# Altium schematic symbol library jlcpcb_2025_04_capacitors_extended_1206.schlib: 2503 symbols (part 2 of 14)
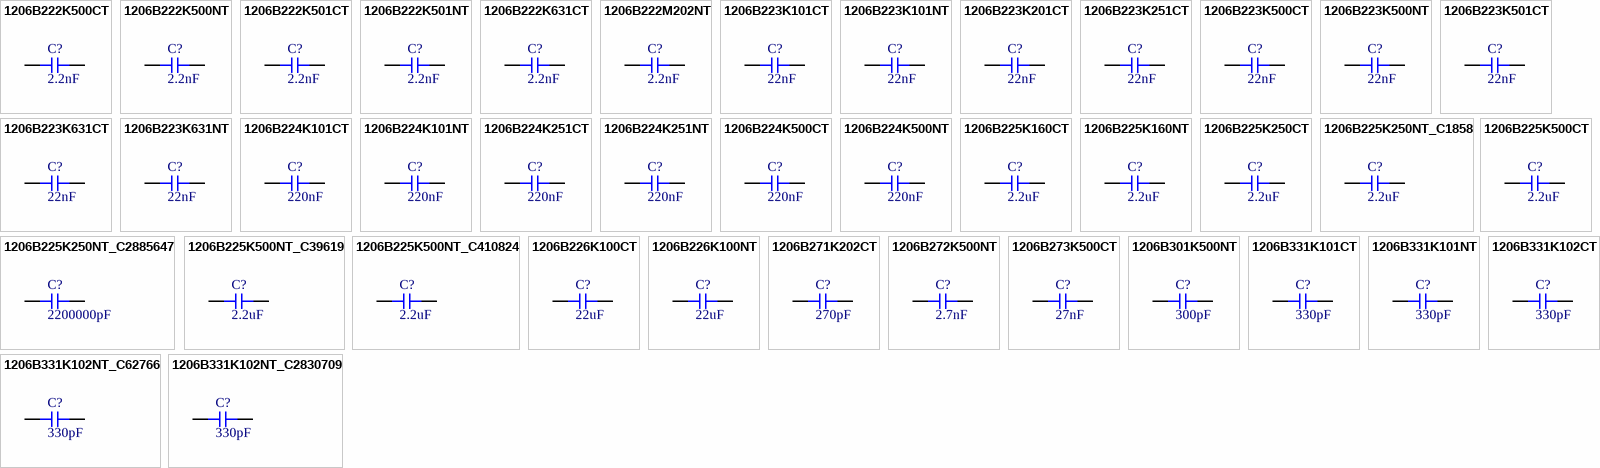
[diagram p63: symbols 1206B222K500CT to 1206B331K102NT_C2830709]

## 1206B224K500NT
designator C?  Capacitance: 220nF  (hidden comment: *)
Capacitor, Ceramic (MLCC), 220nF, ±10%, 50V, X7R, ±10%, SMD 1206; Manufacturer: FH(Guangdong Fenghua Advanced Tech); Manufacturer Part Number: 1206B224K500NT; Package Size: 1206; JLCPCB Basic Part: No; JLCPCB Part Number: C1857; Supplier 1: LCSC; Category: Capacitors - MLCC; Supplier Part Number 1: C1857; Tolerance: ±10%; Voltage Rating: 50V; Temperature Coefficient: X7R; RoHS: Yes; ComponentLink1Description: Datasheet; ComponentLink1URL: https://wmsc.lcsc.com/wmsc/upload/file/pdf/v2/lcsc/2304140030_FH--Guangdong-Fenghua-Advanced-Tech-1206B224K500NT_C1857.pdf; ComponentLink2Description: JLCPCB Part URL; ComponentLink2URL: https://jlcpcb.com/partdetail/C1857; ComponentLink3Description: LCSC Part URL; ComponentLink3URL: https://lcsc.com/product-detail/Multilayer-Ceramic-Capacitors-MLCC---SMD-SMT_FH-Guangdong-Fenghua-Advanced-Tech-FH-Guangdong-Fenghua-Advanced-Tech-1206B224K500NT_C1857.html
footprint CAP-1206 (1206 (3216M) Capacitor)
pins: 1, 2

## 1206B225K160CT
designator C?  Capacitance: 2.2uF  (hidden comment: *)
Capacitor, Ceramic (MLCC), 2.2uF, ±10%, 16V, X7R, ±10%, SMD 1206; Manufacturer: Walsin Tech Corp; Manufacturer Part Number: 1206B225K160CT; Package Size: 1206; JLCPCB Basic Part: No; JLCPCB Part Number: C123658; Supplier 1: LCSC; Category: Capacitors - MLCC; Supplier Part Number 1: C123658; Tolerance: ±10%; Voltage Rating: 16V; Temperature Coefficient: X7R; RoHS: Yes; ComponentLink1Description: Datasheet; ComponentLink1URL: https://wmsc.lcsc.com/wmsc/upload/file/pdf/v2/lcsc/2304140030_Walsin-Tech-Corp-1206B225K160CT_C123658.pdf; ComponentLink2Description: JLCPCB Part URL; ComponentLink2URL: https://jlcpcb.com/partdetail/C123658; ComponentLink3Description: LCSC Part URL; ComponentLink3URL: https://lcsc.com/product-detail/Multilayer-Ceramic-Capacitors-MLCC---SMD-SMT_Walsin-Tech-Corp-Walsin-Tech-Corp-1206B225K160CT_C123658.html
footprint CAP-1206 (1206 (3216M) Capacitor)
pins: 1, 2

## 1206B225K160NT
designator C?  Capacitance: 2.2uF  (hidden comment: *)
Capacitor, Ceramic (MLCC), 2.2uF, ±10%, 16V, X5R, ±10%, SMD 1206; Manufacturer: FH(Guangdong Fenghua Advanced Tech); Manufacturer Part Number: 1206B225K160NT; Package Size: 1206; JLCPCB Basic Part: No; JLCPCB Part Number: C32071; Supplier 1: LCSC; Category: Capacitors - MLCC; Supplier Part Number 1: C32071; Tolerance: ±10%; Voltage Rating: 16V; Temperature Coefficient: X5R; RoHS: Yes; ComponentLink1Description: Datasheet; ComponentLink1URL: https://wmsc.lcsc.com/wmsc/upload/file/pdf/v2/lcsc/1810311313_FH--Guangdong-Fenghua-Advanced-Tech-1206B225K160NT_C32071.pdf; ComponentLink2Description: JLCPCB Part URL; ComponentLink2URL: https://jlcpcb.com/partdetail/C32071; ComponentLink3Description: LCSC Part URL; ComponentLink3URL: https://lcsc.com/product-detail/Multilayer-Ceramic-Capacitors-MLCC---SMD-SMT_FH-Guangdong-Fenghua-Advanced-Tech-FH-Guangdong-Fenghua-Advanced-Tech-1206B225K160NT_C32071.html
footprint CAP-1206 (1206 (3216M) Capacitor)
pins: 1, 2

## 1206B225K250CT
designator C?  Capacitance: 2.2uF  (hidden comment: *)
Capacitor, Ceramic (MLCC), 2.2uF, ±10%, 25V, X7R, ±10%, SMD 1206; Manufacturer: Walsin Tech Corp; Manufacturer Part Number: 1206B225K250CT; Package Size: 1206; JLCPCB Basic Part: No; JLCPCB Part Number: C303957; Supplier 1: LCSC; Category: Capacitors - MLCC; Supplier Part Number 1: C303957; Tolerance: ±10%; Voltage Rating: 25V; Temperature Coefficient: X7R; RoHS: Yes; ComponentLink1Description: Datasheet; ComponentLink1URL: https://wmsc.lcsc.com/wmsc/upload/file/pdf/v2/lcsc/2304140030_Walsin-Tech-Corp-1206B225K250CT_C303957.pdf; ComponentLink2Description: JLCPCB Part URL; ComponentLink2URL: https://jlcpcb.com/partdetail/C303957; ComponentLink3Description: LCSC Part URL; ComponentLink3URL: https://lcsc.com/product-detail/Multilayer-Ceramic-Capacitors-MLCC---SMD-SMT_Walsin-Tech-Corp-Walsin-Tech-Corp-1206B225K250CT_C303957.html
footprint CAP-1206 (1206 (3216M) Capacitor)
pins: 1, 2

## 1206B225K250NT_C1858
designator C?  Capacitance: 2.2uF  (hidden comment: *)
Capacitor, Ceramic (MLCC), 2.2uF, ±10%, 25V, X7R, ±10%, SMD 1206; Manufacturer: FH(Guangdong Fenghua Advanced Tech); Manufacturer Part Number: 1206B225K250NT; Package Size: 1206; JLCPCB Basic Part: No; JLCPCB Part Number: C1858; Supplier 1: LCSC; Category: Capacitors - MLCC; Supplier Part Number 1: C1858; Tolerance: ±10%; Voltage Rating: 25V; Temperature Coefficient: X7R; RoHS: Yes; ComponentLink1Description: Datasheet; ComponentLink1URL: https://wmsc.lcsc.com/wmsc/upload/file/pdf/v2/lcsc/2304140030_FH--Guangdong-Fenghua-Advanced-Tech-1206B225K250NT_C1858.pdf; ComponentLink2Description: JLCPCB Part URL; ComponentLink2URL: https://jlcpcb.com/partdetail/C1858; ComponentLink3Description: LCSC Part URL; ComponentLink3URL: https://lcsc.com/product-detail/Multilayer-Ceramic-Capacitors-MLCC---SMD-SMT_FH-Guangdong-Fenghua-Advanced-Tech-FH-Guangdong-Fenghua-Advanced-Tech-1206B225K250NT_C1858.html
footprint CAP-1206 (1206 (3216M) Capacitor)
pins: 1, 2

## 1206B225K250NT_C2885647
designator C?  Capacitance: 2200000pF  (hidden comment: *)
Capacitor, Ceramic (MLCC), 2200000pF, ±10%, 25V, X7R, ±10%, SMD 1206; Manufacturer: FH (Guangdong Fenghua Advanced Tech); Manufacturer Part Number: 1206B225K250NT; Package Size: 1206; JLCPCB Basic Part: No; JLCPCB Part Number: C2885647; Supplier 1: LCSC; Category: Capacitors - MLCC; Supplier Part Number 1: C2885647; Tolerance: ±10%; Voltage Rating: 25V; Temperature Coefficient: X7R; RoHS: Yes; ComponentLink1Description: Datasheet; ComponentLink1URL: https://wmsc.lcsc.com/wmsc/upload/file/pdf/v2/lcsc/2108150430_FH--Guangdong-Fenghua-Advanced-Tech-1206B225K250NT_C2885647.pdf; ComponentLink2Description: JLCPCB Part URL; ComponentLink2URL: https://jlcpcb.com/partdetail/C2885647; ComponentLink3Description: LCSC Part URL; ComponentLink3URL: https://lcsc.com/product-detail/Multilayer-Ceramic-Capacitors-MLCC---SMD-SMT_FH-Guangdong-Fenghua-Advanced-Tech-FH-Guangdong-Fenghua-Advanced-Tech-1206B225K250NT_C2885647.html
footprint CAP-1206 (1206 (3216M) Capacitor)
pins: 1, 2

## 1206B225K500CT
designator C?  Capacitance: 2.2uF  (hidden comment: *)
Capacitor, Ceramic (MLCC), 2.2uF, ±10%, 50V, X7R, ±10%, SMD 1206; Manufacturer: Walsin Tech Corp; Manufacturer Part Number: 1206B225K500CT; Package Size: 1206; JLCPCB Basic Part: No; JLCPCB Part Number: C396788; Supplier 1: LCSC; Category: Capacitors - MLCC; Supplier Part Number 1: C396788; Tolerance: ±10%; Voltage Rating: 50V; Temperature Coefficient: X7R; RoHS: Yes; ComponentLink1Description: Datasheet; ComponentLink1URL: https://wmsc.lcsc.com/wmsc/upload/file/pdf/v2/lcsc/2304140030_Walsin-Tech-Corp-1206B225K500CT_C396788.pdf; ComponentLink2Description: JLCPCB Part URL; ComponentLink2URL: https://jlcpcb.com/partdetail/C396788; ComponentLink3Description: LCSC Part URL; ComponentLink3URL: https://lcsc.com/product-detail/Multilayer-Ceramic-Capacitors-MLCC---SMD-SMT_Walsin-Tech-Corp-Walsin-Tech-Corp-1206B225K500CT_C396788.html
footprint CAP-1206 (1206 (3216M) Capacitor)
pins: 1, 2

## 1206B225K500NT_C39619
designator C?  Capacitance: 2.2uF  (hidden comment: *)
Capacitor, Ceramic (MLCC), 2.2uF, ±10%, 50V, X7R, ±10%, SMD 1206; Manufacturer: FH(Guangdong Fenghua Advanced Tech); Manufacturer Part Number: 1206B225K500NT; Package Size: 1206; JLCPCB Basic Part: No; JLCPCB Part Number: C39619; Supplier 1: LCSC; Category: Capacitors - MLCC; Supplier Part Number 1: C39619; Tolerance: ±10%; Voltage Rating: 50V; Temperature Coefficient: X7R; RoHS: Yes; ComponentLink1Description: Datasheet; ComponentLink1URL: https://wmsc.lcsc.com/wmsc/upload/file/pdf/v2/lcsc/2304140030_FH--Guangdong-Fenghua-Advanced-Tech-1206B225K500NT_C39619.pdf; ComponentLink2Description: JLCPCB Part URL; ComponentLink2URL: https://jlcpcb.com/partdetail/C39619; ComponentLink3Description: LCSC Part URL; ComponentLink3URL: https://lcsc.com/product-detail/Multilayer-Ceramic-Capacitors-MLCC---SMD-SMT_FH-Guangdong-Fenghua-Advanced-Tech-FH-Guangdong-Fenghua-Advanced-Tech-1206B225K500NT_C39619.html
footprint CAP-1206 (1206 (3216M) Capacitor)
pins: 1, 2

## 1206B225K500NT_C410824
designator C?  Capacitance: 2.2uF  (hidden comment: *)
Capacitor, Ceramic (MLCC), 2.2uF, ±10%, 50V, X7R, ±10%, SMD 1206; Manufacturer: FH(Guangdong Fenghua Advanced Tech); Manufacturer Part Number: 1206B225K500NT; Package Size: 1206; JLCPCB Basic Part: No; JLCPCB Part Number: C410824; Supplier 1: LCSC; Category: Capacitors - MLCC; Supplier Part Number 1: C410824; Tolerance: ±10%; Voltage Rating: 50V; Temperature Coefficient: X7R; RoHS: Yes; ComponentLink1Description: Datasheet; ComponentLink1URL: https://wmsc.lcsc.com/wmsc/upload/file/pdf/v2/lcsc/2304140030_FH--Guangdong-Fenghua-Advanced-Tech-1206B225K500NT_C410824.pdf; ComponentLink2Description: JLCPCB Part URL; ComponentLink2URL: https://jlcpcb.com/partdetail/C410824; ComponentLink3Description: LCSC Part URL; ComponentLink3URL: https://lcsc.com/product-detail/Multilayer-Ceramic-Capacitors-MLCC---SMD-SMT_FH-Guangdong-Fenghua-Advanced-Tech-FH-Guangdong-Fenghua-Advanced-Tech-1206B225K500NT_C410824.html
footprint CAP-1206 (1206 (3216M) Capacitor)
pins: 1, 2

## 1206B226K100CT
designator C?  Capacitance: 22uF  (hidden comment: *)
Capacitor, Ceramic (MLCC), 22uF, ±10%, 10V, X7R, ±10%, SMD 1206; Manufacturer: Walsin Tech Corp; Manufacturer Part Number: 1206B226K100CT; Package Size: 1206; JLCPCB Basic Part: No; JLCPCB Part Number: C237195; Supplier 1: LCSC; Category: Capacitors - MLCC; Supplier Part Number 1: C237195; Tolerance: ±10%; Voltage Rating: 10V; Temperature Coefficient: X7R; RoHS: Yes; ComponentLink1Description: Datasheet; ComponentLink1URL: https://wmsc.lcsc.com/wmsc/upload/file/pdf/v2/lcsc/2209151800_Walsin-Tech-Corp-1206B226K100CT_C237195.pdf; ComponentLink2Description: JLCPCB Part URL; ComponentLink2URL: https://jlcpcb.com/partdetail/C237195; ComponentLink3Description: LCSC Part URL; ComponentLink3URL: https://lcsc.com/product-detail/Multilayer-Ceramic-Capacitors-MLCC---SMD-SMT_Walsin-Tech-Corp-Walsin-Tech-Corp-1206B226K100CT_C237195.html
footprint CAP-1206 (1206 (3216M) Capacitor)
pins: 1, 2

## 1206B226K100NT
designator C?  Capacitance: 22uF  (hidden comment: *)
Capacitor, Ceramic (MLCC), 22uF, ±10%, 10V, X7R, ±10%, SMD 1206; Manufacturer: FH(Guangdong Fenghua Advanced Tech); Manufacturer Part Number: 1206B226K100NT; Package Size: 1206; JLCPCB Basic Part: No; JLCPCB Part Number: C105475; Supplier 1: LCSC; Category: Capacitors - MLCC; Supplier Part Number 1: C105475; Tolerance: ±10%; Voltage Rating: 10V; Temperature Coefficient: X7R; RoHS: Yes; ComponentLink1Description: Datasheet; ComponentLink1URL: https://wmsc.lcsc.com/wmsc/upload/file/pdf/v2/lcsc/2304140030_FH--Guangdong-Fenghua-Advanced-Tech-1206B226K100NT_C105475.pdf; ComponentLink2Description: JLCPCB Part URL; ComponentLink2URL: https://jlcpcb.com/partdetail/C105475; ComponentLink3Description: LCSC Part URL; ComponentLink3URL: https://lcsc.com/product-detail/Multilayer-Ceramic-Capacitors-MLCC---SMD-SMT_FH-Guangdong-Fenghua-Advanced-Tech-FH-Guangdong-Fenghua-Advanced-Tech-1206B226K100NT_C105475.html
footprint CAP-1206 (1206 (3216M) Capacitor)
pins: 1, 2

## 1206B271K202CT
designator C?  Capacitance: 270pF  (hidden comment: *)
Capacitor, Ceramic (MLCC), 270pF, ±10%, 2kV, X7R, ±10%, SMD 1206; Manufacturer: Walsin Tech Corp; Manufacturer Part Number: 1206B271K202CT; Package Size: 1206; JLCPCB Basic Part: No; JLCPCB Part Number: C3881185; Supplier 1: LCSC; Category: Capacitors - MLCC; Supplier Part Number 1: C3881185; Tolerance: ±10%; Voltage Rating: 2kV; Temperature Coefficient: X7R; RoHS: Yes; ComponentLink1Description: Datasheet; ComponentLink1URL: https://wmsc.lcsc.com/wmsc/upload/file/pdf/v2/lcsc/2309201537_Walsin-Tech-Corp-1206B271K202CT_C3881185.pdf; ComponentLink2Description: JLCPCB Part URL; ComponentLink2URL: https://jlcpcb.com/partdetail/C3881185; ComponentLink3Description: LCSC Part URL; ComponentLink3URL: https://lcsc.com/product-detail/Multilayer-Ceramic-Capacitors-MLCC---SMD-SMT_Walsin-Tech-Corp-Walsin-Tech-Corp-1206B271K202CT_C3881185.html
footprint CAP-1206 (1206 (3216M) Capacitor)
pins: 1, 2

## 1206B272K500NT
designator C?  Capacitance: 2.7nF  (hidden comment: *)
Capacitor, Ceramic (MLCC), 2.7nF, ±10%, 50V, X7R, ±10%, SMD 1206; Manufacturer: FH(Guangdong Fenghua Advanced Tech); Manufacturer Part Number: 1206B272K500NT; Package Size: 1206; JLCPCB Basic Part: No; JLCPCB Part Number: C1860; Supplier 1: LCSC; Category: Capacitors - MLCC; Supplier Part Number 1: C1860; Tolerance: ±10%; Voltage Rating: 50V; Temperature Coefficient: X7R; RoHS: Yes; ComponentLink1Description: Datasheet; ComponentLink1URL: https://wmsc.lcsc.com/wmsc/upload/file/pdf/v2/lcsc/2304140030_FH--Guangdong-Fenghua-Advanced-Tech-1206B272K500NT_C1860.pdf; ComponentLink2Description: JLCPCB Part URL; ComponentLink2URL: https://jlcpcb.com/partdetail/C1860; ComponentLink3Description: LCSC Part URL; ComponentLink3URL: https://lcsc.com/product-detail/Multilayer-Ceramic-Capacitors-MLCC---SMD-SMT_FH-Guangdong-Fenghua-Advanced-Tech-FH-Guangdong-Fenghua-Advanced-Tech-1206B272K500NT_C1860.html
footprint CAP-1206 (1206 (3216M) Capacitor)
pins: 1, 2

## 1206B273K500CT
designator C?  Capacitance: 27nF  (hidden comment: *)
Capacitor, Ceramic (MLCC), 27nF, ±10%, 50V, X7R, ±10%, SMD 1206; Manufacturer: Walsin Tech Corp; Manufacturer Part Number: 1206B273K500CT; Package Size: 1206; JLCPCB Basic Part: No; JLCPCB Part Number: C152834; Supplier 1: LCSC; Category: Capacitors - MLCC; Supplier Part Number 1: C152834; Tolerance: ±10%; Voltage Rating: 50V; Temperature Coefficient: X7R; RoHS: Yes; ComponentLink1Description: Datasheet; ComponentLink1URL: https://wmsc.lcsc.com/wmsc/upload/file/pdf/v2/lcsc/2304140030_Walsin-Tech-Corp-1206B273K500CT_C152834.pdf; ComponentLink2Description: JLCPCB Part URL; ComponentLink2URL: https://jlcpcb.com/partdetail/C152834; ComponentLink3Description: LCSC Part URL; ComponentLink3URL: https://lcsc.com/product-detail/Multilayer-Ceramic-Capacitors-MLCC---SMD-SMT_Walsin-Tech-Corp-Walsin-Tech-Corp-1206B273K500CT_C152834.html
footprint CAP-1206 (1206 (3216M) Capacitor)
pins: 1, 2

## 1206B301K500NT
designator C?  Capacitance: 300pF  (hidden comment: *)
Capacitor, Ceramic (MLCC), 300pF, ±10%, 50V, X7R, ±10%, SMD 1206; Manufacturer: FH(Guangdong Fenghua Advanced Tech); Manufacturer Part Number: 1206B301K500NT; Package Size: 1206; JLCPCB Basic Part: No; JLCPCB Part Number: C1861; Supplier 1: LCSC; Category: Capacitors - MLCC; Supplier Part Number 1: C1861; Tolerance: ±10%; Voltage Rating: 50V; Temperature Coefficient: X7R; RoHS: Yes; ComponentLink1Description: Datasheet; ComponentLink1URL: https://wmsc.lcsc.com/wmsc/upload/file/pdf/v2/lcsc/2304140030_FH--Guangdong-Fenghua-Advanced-Tech-1206B301K500NT_C1861.pdf; ComponentLink2Description: JLCPCB Part URL; ComponentLink2URL: https://jlcpcb.com/partdetail/C1861; ComponentLink3Description: LCSC Part URL; ComponentLink3URL: https://lcsc.com/product-detail/Multilayer-Ceramic-Capacitors-MLCC---SMD-SMT_FH-Guangdong-Fenghua-Advanced-Tech-FH-Guangdong-Fenghua-Advanced-Tech-1206B301K500NT_C1861.html
footprint CAP-1206 (1206 (3216M) Capacitor)
pins: 1, 2

## 1206B331K101CT
designator C?  Capacitance: 330pF  (hidden comment: *)
Capacitor, Ceramic (MLCC), 330pF, ±10%, 100V, X7R, ±10%, SMD 1206; Manufacturer: Walsin Tech Corp; Manufacturer Part Number: 1206B331K101CT; Package Size: 1206; JLCPCB Basic Part: No; JLCPCB Part Number: C152965; Supplier 1: LCSC; Category: Capacitors - MLCC; Supplier Part Number 1: C152965; Tolerance: ±10%; Voltage Rating: 100V; Temperature Coefficient: X7R; RoHS: Yes; ComponentLink1Description: Datasheet; ComponentLink1URL: https://wmsc.lcsc.com/wmsc/upload/file/pdf/v2/lcsc/2304140030_Walsin-Tech-Corp-1206B331K101CT_C152965.pdf; ComponentLink2Description: JLCPCB Part URL; ComponentLink2URL: https://jlcpcb.com/partdetail/C152965; ComponentLink3Description: LCSC Part URL; ComponentLink3URL: https://lcsc.com/product-detail/Multilayer-Ceramic-Capacitors-MLCC---SMD-SMT_Walsin-Tech-Corp-Walsin-Tech-Corp-1206B331K101CT_C152965.html
footprint CAP-1206 (1206 (3216M) Capacitor)
pins: 1, 2

## 1206B331K101NT
designator C?  Capacitance: 330pF  (hidden comment: *)
Capacitor, Ceramic (MLCC), 330pF, ±10%, 100V, X7R, ±10%, SMD 1206; Manufacturer: FH(Guangdong Fenghua Advanced Tech); Manufacturer Part Number: 1206B331K101NT; Package Size: 1206; JLCPCB Basic Part: No; JLCPCB Part Number: C507079; Supplier 1: LCSC; Category: Capacitors - MLCC; Supplier Part Number 1: C507079; Tolerance: ±10%; Voltage Rating: 100V; Temperature Coefficient: X7R; RoHS: Yes; ComponentLink1Description: Datasheet; ComponentLink1URL: https://wmsc.lcsc.com/wmsc/upload/file/pdf/v2/lcsc/2304140030_FH--Guangdong-Fenghua-Advanced-Tech-1206B331K101NT_C507079.pdf; ComponentLink2Description: JLCPCB Part URL; ComponentLink2URL: https://jlcpcb.com/partdetail/C507079; ComponentLink3Description: LCSC Part URL; ComponentLink3URL: https://lcsc.com/product-detail/Multilayer-Ceramic-Capacitors-MLCC---SMD-SMT_FH-Guangdong-Fenghua-Advanced-Tech-FH-Guangdong-Fenghua-Advanced-Tech-1206B331K101NT_C507079.html
footprint CAP-1206 (1206 (3216M) Capacitor)
pins: 1, 2

## 1206B331K102CT
designator C?  Capacitance: 330pF  (hidden comment: *)
Capacitor, Ceramic (MLCC), 330pF, ±10%, 1kV, X7R, ±10%, SMD 1206; Manufacturer: Walsin Tech Corp; Manufacturer Part Number: 1206B331K102CT; Package Size: 1206; JLCPCB Basic Part: No; JLCPCB Part Number: C384737; Supplier 1: LCSC; Category: Capacitors - MLCC; Supplier Part Number 1: C384737; Tolerance: ±10%; Voltage Rating: 1kV; Temperature Coefficient: X7R; RoHS: Yes; ComponentLink1Description: Datasheet; ComponentLink1URL: https://wmsc.lcsc.com/wmsc/upload/file/pdf/v2/lcsc/2304140030_Walsin-Tech-Corp-1206B331K102CT_C384737.pdf; ComponentLink2Description: JLCPCB Part URL; ComponentLink2URL: https://jlcpcb.com/partdetail/C384737; ComponentLink3Description: LCSC Part URL; ComponentLink3URL: https://lcsc.com/product-detail/Multilayer-Ceramic-Capacitors-MLCC---SMD-SMT_Walsin-Tech-Corp-Walsin-Tech-Corp-1206B331K102CT_C384737.html
footprint CAP-1206 (1206 (3216M) Capacitor)
pins: 1, 2

## 1206B331K102NT_C62766
designator C?  Capacitance: 330pF  (hidden comment: *)
Capacitor, Ceramic (MLCC), 330pF, ±10%, 1kV, X7R, ±10%, SMD 1206; Manufacturer: FH(Guangdong Fenghua Advanced Tech); Manufacturer Part Number: 1206B331K102NT; Package Size: 1206; JLCPCB Basic Part: No; JLCPCB Part Number: C62766; Supplier 1: LCSC; Category: Capacitors - MLCC; Supplier Part Number 1: C62766; Tolerance: ±10%; Voltage Rating: 1kV; Temperature Coefficient: X7R; RoHS: Yes; ComponentLink1Description: Datasheet; ComponentLink1URL: https://wmsc.lcsc.com/wmsc/upload/file/pdf/v2/lcsc/2304140030_FH--Guangdong-Fenghua-Advanced-Tech-1206B331K102NT_C62766.pdf; ComponentLink2Description: JLCPCB Part URL; ComponentLink2URL: https://jlcpcb.com/partdetail/C62766; ComponentLink3Description: LCSC Part URL; ComponentLink3URL: https://lcsc.com/product-detail/Multilayer-Ceramic-Capacitors-MLCC---SMD-SMT_FH-Guangdong-Fenghua-Advanced-Tech-FH-Guangdong-Fenghua-Advanced-Tech-1206B331K102NT_C62766.html
footprint CAP-1206 (1206 (3216M) Capacitor)
pins: 1, 2

## 1206B331K102NT_C2830709
designator C?  Capacitance: 330pF  (hidden comment: *)
Capacitor, Ceramic (MLCC), 330pF, ±10%, 1kV, ±10%, SMD 1206; Manufacturer: FH-BK(Guangdong Fenghua Bangke Elec); Manufacturer Part Number: 1206B331K102NT; Package Size: 1206; JLCPCB Basic Part: No; JLCPCB Part Number: C2830709; Supplier 1: LCSC; Category: Capacitors - MLCC; Supplier Part Number 1: C2830709; Tolerance: ±10%; Voltage Rating: 1kV; RoHS: Yes; ComponentLink1Description: Datasheet; ComponentLink1URL: https://wmsc.lcsc.com/wmsc/upload/file/pdf/v2/lcsc/2105241612_FH-BK-Guangdong-Fenghua-Bangke-Elec-1206B331K102NT_C2830709.pdf; ComponentLink2Description: JLCPCB Part URL; ComponentLink2URL: https://jlcpcb.com/partdetail/C2830709; ComponentLink3Description: LCSC Part URL; ComponentLink3URL: https://lcsc.com/product-detail/Multilayer-Ceramic-Capacitors-MLCC---SMD-SMT_FH-BKGuangdong-Fenghua-Bangke-Elec-FH-BKGuangdong-Fenghua-Bangke-Elec-1206B331K102NT_C2830709.html
footprint CAP-1206 (1206 (3216M) Capacitor)
pins: 1, 2

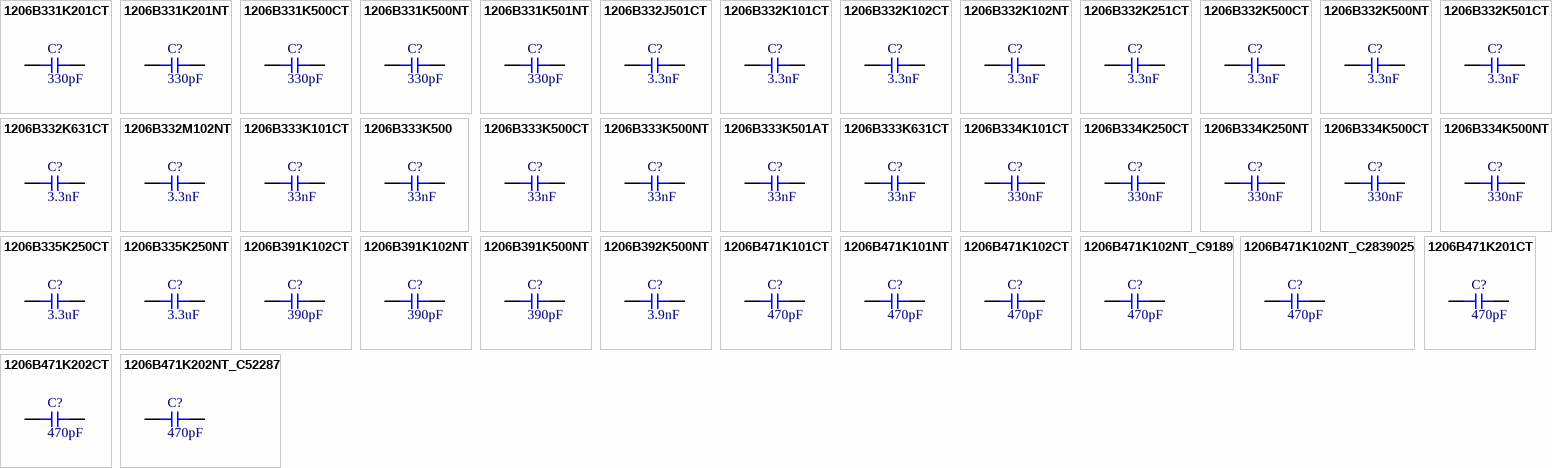
[diagram p5: symbols 1206B331K201CT to 1206B471K202NT_C52287]

## 1206B331K201CT
designator C?  Capacitance: 330pF  (hidden comment: *)
Capacitor, Ceramic (MLCC), 330pF, ±10%, 200V, X7R, ±10%, SMD 1206; Manufacturer: Walsin Tech Corp; Manufacturer Part Number: 1206B331K201CT; Package Size: 1206; JLCPCB Basic Part: No; JLCPCB Part Number: C237208; Supplier 1: LCSC; Category: Capacitors - MLCC; Supplier Part Number 1: C237208; Tolerance: ±10%; Voltage Rating: 200V; Temperature Coefficient: X7R; RoHS: Yes; ComponentLink1Description: Datasheet; ComponentLink1URL: https://wmsc.lcsc.com/wmsc/upload/file/pdf/v2/lcsc/2304140030_Walsin-Tech-Corp-1206B331K201CT_C237208.pdf; ComponentLink2Description: JLCPCB Part URL; ComponentLink2URL: https://jlcpcb.com/partdetail/C237208; ComponentLink3Description: LCSC Part URL; ComponentLink3URL: https://lcsc.com/product-detail/Multilayer-Ceramic-Capacitors-MLCC---SMD-SMT_Walsin-Tech-Corp-Walsin-Tech-Corp-1206B331K201CT_C237208.html
footprint CAP-1206 (1206 (3216M) Capacitor)
pins: 1, 2

## 1206B331K201NT
designator C?  Capacitance: 330pF  (hidden comment: *)
Capacitor, Ceramic (MLCC), 330pF, ±10%, 200V, ±10%, SMD 1206; Manufacturer: FH(Guangdong Fenghua Advanced Tech); Manufacturer Part Number: 1206B331K201NT; Package Size: 1206; JLCPCB Basic Part: No; JLCPCB Part Number: C1322384; Supplier 1: LCSC; Category: Capacitors - MLCC; Supplier Part Number 1: C1322384; Tolerance: ±10%; Voltage Rating: 200V; RoHS: Yes; ComponentLink1Description: Datasheet; ComponentLink1URL: https://wmsc.lcsc.com/wmsc/upload/file/pdf/v2/lcsc/2304140030_FH--Guangdong-Fenghua-Advanced-Tech-1206B331K201NT_C1322384.pdf; ComponentLink2Description: JLCPCB Part URL; ComponentLink2URL: https://jlcpcb.com/partdetail/C1322384; ComponentLink3Description: LCSC Part URL; ComponentLink3URL: https://lcsc.com/product-detail/Multilayer-Ceramic-Capacitors-MLCC---SMD-SMT_FH-Guangdong-Fenghua-Advanced-Tech-FH-Guangdong-Fenghua-Advanced-Tech-1206B331K201NT_C1322384.html
footprint CAP-1206 (1206 (3216M) Capacitor)
pins: 1, 2

## 1206B331K500CT
designator C?  Capacitance: 330pF  (hidden comment: *)
Capacitor, Ceramic (MLCC), 330pF, ±10%, 50V, X7R, ±10%, SMD 1206; Manufacturer: Walsin Tech Corp; Manufacturer Part Number: 1206B331K500CT; Package Size: 1206; JLCPCB Basic Part: No; JLCPCB Part Number: C152833; Supplier 1: LCSC; Category: Capacitors - MLCC; Supplier Part Number 1: C152833; Tolerance: ±10%; Voltage Rating: 50V; Temperature Coefficient: X7R; RoHS: Yes; ComponentLink1Description: Datasheet; ComponentLink1URL: https://wmsc.lcsc.com/wmsc/upload/file/pdf/v2/lcsc/2304140030_Walsin-Tech-Corp-1206B331K500CT_C152833.pdf; ComponentLink2Description: JLCPCB Part URL; ComponentLink2URL: https://jlcpcb.com/partdetail/C152833; ComponentLink3Description: LCSC Part URL; ComponentLink3URL: https://lcsc.com/product-detail/Multilayer-Ceramic-Capacitors-MLCC---SMD-SMT_Walsin-Tech-Corp-Walsin-Tech-Corp-1206B331K500CT_C152833.html
footprint CAP-1206 (1206 (3216M) Capacitor)
pins: 1, 2

## 1206B331K500NT
designator C?  Capacitance: 330pF  (hidden comment: *)
Capacitor, Ceramic (MLCC), 330pF, ±10%, 50V, X7R, ±10%, SMD 1206; Manufacturer: FH(Guangdong Fenghua Advanced Tech); Manufacturer Part Number: 1206B331K500NT; Package Size: 1206; JLCPCB Basic Part: No; JLCPCB Part Number: C1862; Supplier 1: LCSC; Category: Capacitors - MLCC; Supplier Part Number 1: C1862; Tolerance: ±10%; Voltage Rating: 50V; Temperature Coefficient: X7R; RoHS: Yes; ComponentLink1Description: Datasheet; ComponentLink1URL: https://wmsc.lcsc.com/wmsc/upload/file/pdf/v2/lcsc/2304140030_FH--Guangdong-Fenghua-Advanced-Tech-1206B331K500NT_C1862.pdf; ComponentLink2Description: JLCPCB Part URL; ComponentLink2URL: https://jlcpcb.com/partdetail/C1862; ComponentLink3Description: LCSC Part URL; ComponentLink3URL: https://lcsc.com/product-detail/Multilayer-Ceramic-Capacitors-MLCC---SMD-SMT_FH-Guangdong-Fenghua-Advanced-Tech-FH-Guangdong-Fenghua-Advanced-Tech-1206B331K500NT_C1862.html
footprint CAP-1206 (1206 (3216M) Capacitor)
pins: 1, 2

## 1206B331K501NT
designator C?  Capacitance: 330pF  (hidden comment: *)
Capacitor, Ceramic (MLCC), 330pF, ±10%, 500V, X7R, ±10%, SMD 1206; Manufacturer: FH(Guangdong Fenghua Advanced Tech); Manufacturer Part Number: 1206B331K501NT; Package Size: 1206; JLCPCB Basic Part: No; JLCPCB Part Number: C46377; Supplier 1: LCSC; Category: Capacitors - MLCC; Supplier Part Number 1: C46377; Tolerance: ±10%; Voltage Rating: 500V; Temperature Coefficient: X7R; RoHS: Yes; ComponentLink1Description: Datasheet; ComponentLink1URL: https://wmsc.lcsc.com/wmsc/upload/file/pdf/v2/lcsc/2304140030_FH--Guangdong-Fenghua-Advanced-Tech-1206B331K501NT_C46377.pdf; ComponentLink2Description: JLCPCB Part URL; ComponentLink2URL: https://jlcpcb.com/partdetail/C46377; ComponentLink3Description: LCSC Part URL; ComponentLink3URL: https://lcsc.com/product-detail/Multilayer-Ceramic-Capacitors-MLCC---SMD-SMT_FH-Guangdong-Fenghua-Advanced-Tech-FH-Guangdong-Fenghua-Advanced-Tech-1206B331K501NT_C46377.html
footprint CAP-1206 (1206 (3216M) Capacitor)
pins: 1, 2

## 1206B332J501CT
designator C?  Capacitance: 3.3nF  (hidden comment: *)
Capacitor, Ceramic (MLCC), 3.3nF, ±5%, 500V, X7R, ±5%, SMD 1206; Manufacturer: Walsin Tech Corp; Manufacturer Part Number: 1206B332J501CT; Package Size: 1206; JLCPCB Basic Part: No; JLCPCB Part Number: C303958; Supplier 1: LCSC; Category: Capacitors - MLCC; Supplier Part Number 1: C303958; Tolerance: ±5%; Voltage Rating: 500V; Temperature Coefficient: X7R; RoHS: Yes; ComponentLink1Description: Datasheet; ComponentLink1URL: https://wmsc.lcsc.com/wmsc/upload/file/pdf/v2/lcsc/2304231850_Walsin-Tech-Corp-1206B332J501CT_C303958.pdf; ComponentLink2Description: JLCPCB Part URL; ComponentLink2URL: https://jlcpcb.com/partdetail/C303958; ComponentLink3Description: LCSC Part URL; ComponentLink3URL: https://lcsc.com/product-detail/Multilayer-Ceramic-Capacitors-MLCC---SMD-SMT_Walsin-Tech-Corp-Walsin-Tech-Corp-1206B332J501CT_C303958.html
footprint CAP-1206 (1206 (3216M) Capacitor)
pins: 1, 2

## 1206B332K101CT
designator C?  Capacitance: 3.3nF  (hidden comment: *)
Capacitor, Ceramic (MLCC), 3.3nF, ±10%, 100V, X7R, ±10%, SMD 1206; Manufacturer: Walsin Tech Corp; Manufacturer Part Number: 1206B332K101CT; Package Size: 1206; JLCPCB Basic Part: No; JLCPCB Part Number: C3860752; Supplier 1: LCSC; Category: Capacitors - MLCC; Supplier Part Number 1: C3860752; Tolerance: ±10%; Voltage Rating: 100V; Temperature Coefficient: X7R; RoHS: Yes; ComponentLink1Description: Datasheet; ComponentLink1URL: https://wmsc.lcsc.com/wmsc/upload/file/pdf/v2/lcsc/2401181642_Walsin-Tech-Corp-1206B332K101CT_C3860752.pdf; ComponentLink2Description: JLCPCB Part URL; ComponentLink2URL: https://jlcpcb.com/partdetail/C3860752; ComponentLink3Description: LCSC Part URL; ComponentLink3URL: https://lcsc.com/product-detail/Multilayer-Ceramic-Capacitors-MLCC---SMD-SMT_Walsin-Tech-Corp-Walsin-Tech-Corp-1206B332K101CT_C3860752.html
footprint CAP-1206 (1206 (3216M) Capacitor)
pins: 1, 2

## 1206B332K102CT
designator C?  Capacitance: 3.3nF  (hidden comment: *)
Capacitor, Ceramic (MLCC), 3.3nF, ±10%, 1kV, X7R, ±10%, SMD 1206; Manufacturer: Walsin Tech Corp; Manufacturer Part Number: 1206B332K102CT; Package Size: 1206; JLCPCB Basic Part: No; JLCPCB Part Number: C152964; Supplier 1: LCSC; Category: Capacitors - MLCC; Supplier Part Number 1: C152964; Tolerance: ±10%; Voltage Rating: 1kV; Temperature Coefficient: X7R; RoHS: Yes; ComponentLink1Description: Datasheet; ComponentLink2Description: JLCPCB Part URL; ComponentLink2URL: https://jlcpcb.com/partdetail/C152964; ComponentLink3Description: LCSC Part URL; ComponentLink3URL: https://lcsc.com/product-detail/Multilayer-Ceramic-Capacitors-MLCC---SMD-SMT_Walsin-Tech-Corp-Walsin-Tech-Corp-1206B332K102CT_C152964.html
footprint CAP-1206 (1206 (3216M) Capacitor)
pins: 1, 2

## 1206B332K102NT
designator C?  Capacitance: 3.3nF  (hidden comment: *)
Capacitor, Ceramic (MLCC), 3.3nF, ±10%, 1kV, X7R, ±10%, SMD 1206; Manufacturer: FH(Guangdong Fenghua Advanced Tech); Manufacturer Part Number: 1206B332K102NT; Package Size: 1206; JLCPCB Basic Part: No; JLCPCB Part Number: C9193; Supplier 1: LCSC; Category: Capacitors - MLCC; Supplier Part Number 1: C9193; Tolerance: ±10%; Voltage Rating: 1kV; Temperature Coefficient: X7R; RoHS: Yes; ComponentLink1Description: Datasheet; ComponentLink1URL: https://wmsc.lcsc.com/wmsc/upload/file/pdf/v2/lcsc/2304140030_FH--Guangdong-Fenghua-Advanced-Tech-1206B332K102NT_C9193.pdf; ComponentLink2Description: JLCPCB Part URL; ComponentLink2URL: https://jlcpcb.com/partdetail/C9193; ComponentLink3Description: LCSC Part URL; ComponentLink3URL: https://lcsc.com/product-detail/Multilayer-Ceramic-Capacitors-MLCC---SMD-SMT_FH-Guangdong-Fenghua-Advanced-Tech-FH-Guangdong-Fenghua-Advanced-Tech-1206B332K102NT_C9193.html
footprint CAP-1206 (1206 (3216M) Capacitor)
pins: 1, 2

## 1206B332K251CT
designator C?  Capacitance: 3.3nF  (hidden comment: *)
Capacitor, Ceramic (MLCC), 3.3nF, ±10%, 250V, X7R, ±10%, SMD 1206; Manufacturer: Walsin Tech Corp; Manufacturer Part Number: 1206B332K251CT; Package Size: 1206; JLCPCB Basic Part: No; JLCPCB Part Number: C152963; Supplier 1: LCSC; Category: Capacitors - MLCC; Supplier Part Number 1: C152963; Tolerance: ±10%; Voltage Rating: 250V; Temperature Coefficient: X7R; RoHS: Yes; ComponentLink1Description: Datasheet; ComponentLink1URL: https://wmsc.lcsc.com/wmsc/upload/file/pdf/v2/lcsc/2304140030_Walsin-Tech-Corp-1206B332K251CT_C152963.pdf; ComponentLink2Description: JLCPCB Part URL; ComponentLink2URL: https://jlcpcb.com/partdetail/C152963; ComponentLink3Description: LCSC Part URL; ComponentLink3URL: https://lcsc.com/product-detail/Multilayer-Ceramic-Capacitors-MLCC---SMD-SMT_Walsin-Tech-Corp-Walsin-Tech-Corp-1206B332K251CT_C152963.html
footprint CAP-1206 (1206 (3216M) Capacitor)
pins: 1, 2

## 1206B332K500CT
designator C?  Capacitance: 3.3nF  (hidden comment: *)
Capacitor, Ceramic (MLCC), 3.3nF, ±10%, 50V, X7R, ±10%, SMD 1206; Manufacturer: Walsin Tech Corp; Manufacturer Part Number: 1206B332K500CT; Package Size: 1206; JLCPCB Basic Part: No; JLCPCB Part Number: C152832; Supplier 1: LCSC; Category: Capacitors - MLCC; Supplier Part Number 1: C152832; Tolerance: ±10%; Voltage Rating: 50V; Temperature Coefficient: X7R; RoHS: Yes; ComponentLink1Description: Datasheet; ComponentLink1URL: https://wmsc.lcsc.com/wmsc/upload/file/pdf/v2/lcsc/2304140030_Walsin-Tech-Corp-1206B332K500CT_C152832.pdf; ComponentLink2Description: JLCPCB Part URL; ComponentLink2URL: https://jlcpcb.com/partdetail/C152832; ComponentLink3Description: LCSC Part URL; ComponentLink3URL: https://lcsc.com/product-detail/Multilayer-Ceramic-Capacitors-MLCC---SMD-SMT_Walsin-Tech-Corp-Walsin-Tech-Corp-1206B332K500CT_C152832.html
footprint CAP-1206 (1206 (3216M) Capacitor)
pins: 1, 2

## 1206B332K500NT
designator C?  Capacitance: 3.3nF  (hidden comment: *)
Capacitor, Ceramic (MLCC), 3.3nF, ±10%, 50V, X7R, ±10%, SMD 1206; Manufacturer: FH(Guangdong Fenghua Advanced Tech); Manufacturer Part Number: 1206B332K500NT; Package Size: 1206; JLCPCB Basic Part: No; JLCPCB Part Number: C1863; Supplier 1: LCSC; Category: Capacitors - MLCC; Supplier Part Number 1: C1863; Tolerance: ±10%; Voltage Rating: 50V; Temperature Coefficient: X7R; RoHS: Yes; ComponentLink1Description: Datasheet; ComponentLink1URL: https://wmsc.lcsc.com/wmsc/upload/file/pdf/v2/lcsc/2304140030_FH--Guangdong-Fenghua-Advanced-Tech-1206B332K500NT_C1863.pdf; ComponentLink2Description: JLCPCB Part URL; ComponentLink2URL: https://jlcpcb.com/partdetail/C1863; ComponentLink3Description: LCSC Part URL; ComponentLink3URL: https://lcsc.com/product-detail/Multilayer-Ceramic-Capacitors-MLCC---SMD-SMT_FH-Guangdong-Fenghua-Advanced-Tech-FH-Guangdong-Fenghua-Advanced-Tech-1206B332K500NT_C1863.html
footprint CAP-1206 (1206 (3216M) Capacitor)
pins: 1, 2

## 1206B332K501CT
designator C?  Capacitance: 3.3nF  (hidden comment: *)
Capacitor, Ceramic (MLCC), 3.3nF, ±10%, 500V, X7R, ±10%, SMD 1206; Manufacturer: Walsin Tech Corp; Manufacturer Part Number: 1206B332K501CT; Package Size: 1206; JLCPCB Basic Part: No; JLCPCB Part Number: C458938; Supplier 1: LCSC; Category: Capacitors - MLCC; Supplier Part Number 1: C458938; Tolerance: ±10%; Voltage Rating: 500V; Temperature Coefficient: X7R; RoHS: Yes; ComponentLink1Description: Datasheet; ComponentLink1URL: https://wmsc.lcsc.com/wmsc/upload/file/pdf/v2/lcsc/2304140030_Walsin-Tech-Corp-1206B332K501CT_C458938.pdf; ComponentLink2Description: JLCPCB Part URL; ComponentLink2URL: https://jlcpcb.com/partdetail/C458938; ComponentLink3Description: LCSC Part URL; ComponentLink3URL: https://lcsc.com/product-detail/Multilayer-Ceramic-Capacitors-MLCC---SMD-SMT_Walsin-Tech-Corp-Walsin-Tech-Corp-1206B332K501CT_C458938.html
footprint CAP-1206 (1206 (3216M) Capacitor)
pins: 1, 2

## 1206B332K631CT
designator C?  Capacitance: 3.3nF  (hidden comment: *)
Capacitor, Ceramic (MLCC), 3.3nF, ±10%, 630V, X7R, ±10%, SMD 1206; Manufacturer: Walsin Tech Corp; Manufacturer Part Number: 1206B332K631CT; Package Size: 1206; JLCPCB Basic Part: No; JLCPCB Part Number: C396789; Supplier 1: LCSC; Category: Capacitors - MLCC; Supplier Part Number 1: C396789; Tolerance: ±10%; Voltage Rating: 630V; Temperature Coefficient: X7R; RoHS: Yes; ComponentLink1Description: Datasheet; ComponentLink1URL: https://wmsc.lcsc.com/wmsc/upload/file/pdf/v2/lcsc/2304140030_Walsin-Tech-Corp-1206B332K631CT_C396789.pdf; ComponentLink2Description: JLCPCB Part URL; ComponentLink2URL: https://jlcpcb.com/partdetail/C396789; ComponentLink3Description: LCSC Part URL; ComponentLink3URL: https://lcsc.com/product-detail/Multilayer-Ceramic-Capacitors-MLCC---SMD-SMT_Walsin-Tech-Corp-Walsin-Tech-Corp-1206B332K631CT_C396789.html
footprint CAP-1206 (1206 (3216M) Capacitor)
pins: 1, 2

## 1206B332M102NT
designator C?  Capacitance: 3.3nF  (hidden comment: *)
Capacitor, Ceramic (MLCC), 3.3nF, ±20%, 1kV, ±20%, SMD 1206; Manufacturer: FH-BK(Guangdong Fenghua Bangke Elec); Manufacturer Part Number: 1206B332M102NT; Package Size: 1206; JLCPCB Basic Part: No; JLCPCB Part Number: C2830708; Supplier 1: LCSC; Category: Capacitors - MLCC; Supplier Part Number 1: C2830708; Tolerance: ±20%; Voltage Rating: 1kV; RoHS: Yes; ComponentLink1Description: Datasheet; ComponentLink1URL: https://wmsc.lcsc.com/wmsc/upload/file/pdf/v2/lcsc/2105241612_FH-BK-Guangdong-Fenghua-Bangke-Elec-1206B332M102NT_C2830708.pdf; ComponentLink2Description: JLCPCB Part URL; ComponentLink2URL: https://jlcpcb.com/partdetail/C2830708; ComponentLink3Description: LCSC Part URL; ComponentLink3URL: https://lcsc.com/product-detail/Multilayer-Ceramic-Capacitors-MLCC---SMD-SMT_FH-BKGuangdong-Fenghua-Bangke-Elec-FH-BKGuangdong-Fenghua-Bangke-Elec-1206B332M102NT_C2830708.html
footprint CAP-1206 (1206 (3216M) Capacitor)
pins: 1, 2

## 1206B333K101CT
designator C?  Capacitance: 33nF  (hidden comment: *)
Capacitor, Ceramic (MLCC), 33nF, ±10%, 100V, X7R, ±10%, SMD 1206; Manufacturer: Walsin Tech Corp; Manufacturer Part Number: 1206B333K101CT; Package Size: 1206; JLCPCB Basic Part: No; JLCPCB Part Number: C2992621; Supplier 1: LCSC; Category: Capacitors - MLCC; Supplier Part Number 1: C2992621; Tolerance: ±10%; Voltage Rating: 100V; Temperature Coefficient: X7R; RoHS: Yes; ComponentLink1Description: Datasheet; ComponentLink1URL: https://wmsc.lcsc.com/wmsc/upload/file/pdf/v2/lcsc/2204121445_Walsin-Tech-Corp-1206B333K101CT_C2992621.pdf; ComponentLink2Description: JLCPCB Part URL; ComponentLink2URL: https://jlcpcb.com/partdetail/C2992621; ComponentLink3Description: LCSC Part URL; ComponentLink3URL: https://lcsc.com/product-detail/Multilayer-Ceramic-Capacitors-MLCC---SMD-SMT_Walsin-Tech-Corp-Walsin-Tech-Corp-1206B333K101CT_C2992621.html
footprint CAP-1206 (1206 (3216M) Capacitor)
pins: 1, 2

## 1206B333K500
designator C?  Capacitance: 33nF  (hidden comment: *)
Capacitor, Ceramic (MLCC), 33nF, ±10%, 50V, X7R, ±10%, SMD 1206; Manufacturer: Walsin Tech Corp; Manufacturer Part Number: 1206B333K500; Package Size: 1206; JLCPCB Basic Part: No; JLCPCB Part Number: C152831; Supplier 1: LCSC; Category: Capacitors - MLCC; Supplier Part Number 1: C152831; Tolerance: ±10%; Voltage Rating: 50V; Temperature Coefficient: X7R; RoHS: Yes; ComponentLink1Description: Datasheet; ComponentLink1URL: https://wmsc.lcsc.com/wmsc/upload/file/pdf/v2/lcsc/2304140030_Walsin-Tech-Corp-1206B333K500_C152831.pdf; ComponentLink2Description: JLCPCB Part URL; ComponentLink2URL: https://jlcpcb.com/partdetail/C152831; ComponentLink3Description: LCSC Part URL; ComponentLink3URL: https://lcsc.com/product-detail/Multilayer-Ceramic-Capacitors-MLCC---SMD-SMT_Walsin-Tech-Corp-Walsin-Tech-Corp-1206B333K500_C152831.html
footprint CAP-1206 (1206 (3216M) Capacitor)
pins: 1, 2

## 1206B333K500CT
designator C?  Capacitance: 33nF  (hidden comment: *)
Capacitor, Ceramic (MLCC), 33nF, ±10%, 50V, X7R, ±10%, SMD 1206; Manufacturer: Walsin Tech Corp; Manufacturer Part Number: 1206B333K500CT; Package Size: 1206; JLCPCB Basic Part: No; JLCPCB Part Number: C2443236; Supplier 1: LCSC; Category: Capacitors - MLCC; Supplier Part Number 1: C2443236; Tolerance: ±10%; Voltage Rating: 50V; Temperature Coefficient: X7R; RoHS: Yes; ComponentLink1Description: Datasheet; ComponentLink1URL: https://wmsc.lcsc.com/wmsc/upload/file/pdf/v2/lcsc/2401181240_Walsin-Tech-Corp-1206B333K500CT_C2443236.pdf; ComponentLink2Description: JLCPCB Part URL; ComponentLink2URL: https://jlcpcb.com/partdetail/C2443236; ComponentLink3Description: LCSC Part URL; ComponentLink3URL: https://lcsc.com/product-detail/Multilayer-Ceramic-Capacitors-MLCC---SMD-SMT_Walsin-Tech-Corp-Walsin-Tech-Corp-1206B333K500CT_C2443236.html
footprint CAP-1206 (1206 (3216M) Capacitor)
pins: 1, 2

## 1206B333K500NT
designator C?  Capacitance: 33nF  (hidden comment: *)
Capacitor, Ceramic (MLCC), 33nF, ±10%, 50V, X7R, ±10%, SMD 1206; Manufacturer: FH(Guangdong Fenghua Advanced Tech); Manufacturer Part Number: 1206B333K500NT; Package Size: 1206; JLCPCB Basic Part: No; JLCPCB Part Number: C1864; Supplier 1: LCSC; Category: Capacitors - MLCC; Supplier Part Number 1: C1864; Tolerance: ±10%; Voltage Rating: 50V; Temperature Coefficient: X7R; RoHS: Yes; ComponentLink1Description: Datasheet; ComponentLink1URL: https://wmsc.lcsc.com/wmsc/upload/file/pdf/v2/lcsc/2304140030_FH--Guangdong-Fenghua-Advanced-Tech-1206B333K500NT_C1864.pdf; ComponentLink2Description: JLCPCB Part URL; ComponentLink2URL: https://jlcpcb.com/partdetail/C1864; ComponentLink3Description: LCSC Part URL; ComponentLink3URL: https://lcsc.com/product-detail/Multilayer-Ceramic-Capacitors-MLCC---SMD-SMT_FH-Guangdong-Fenghua-Advanced-Tech-FH-Guangdong-Fenghua-Advanced-Tech-1206B333K500NT_C1864.html
footprint CAP-1206 (1206 (3216M) Capacitor)
pins: 1, 2

## 1206B333K501AT
designator C?  Capacitance: 33nF  (hidden comment: *)
Capacitor, Ceramic (MLCC), 33nF, 500V, X7R, SMD 1206; Manufacturer: FH (Guangdong Fenghua Advanced Tech); Manufacturer Part Number: 1206B333K501AT; Package Size: 1206; JLCPCB Basic Part: No; JLCPCB Part Number: C3037664; Supplier 1: LCSC; Category: Capacitors - MLCC; Supplier Part Number 1: C3037664; Voltage Rating: 500V; Temperature Coefficient: X7R; RoHS: Yes; ComponentLink1Description: Datasheet; ComponentLink1URL: https://wmsc.lcsc.com/wmsc/upload/file/pdf/v2/lcsc/2206171645_FH--Guangdong-Fenghua-Advanced-Tech-1206B333K501AT_C3037664.pdf; ComponentLink2Description: JLCPCB Part URL; ComponentLink2URL: https://jlcpcb.com/partdetail/C3037664; ComponentLink3Description: LCSC Part URL; ComponentLink3URL: https://lcsc.com/product-detail/Multilayer-Ceramic-Capacitors-MLCC---SMD-SMT_FH-Guangdong-Fenghua-Advanced-Tech-FH-Guangdong-Fenghua-Advanced-Tech-1206B333K501AT_C3037664.html
footprint CAP-1206 (1206 (3216M) Capacitor)
pins: 1, 2

## 1206B333K631CT
designator C?  Capacitance: 33nF  (hidden comment: *)
Capacitor, Ceramic (MLCC), 33nF, ±10%, 630V, X7R, ±10%, SMD 1206; Manufacturer: Walsin Tech Corp; Manufacturer Part Number: 1206B333K631CT; Package Size: 1206; JLCPCB Basic Part: No; JLCPCB Part Number: C152962; Supplier 1: LCSC; Category: Capacitors - MLCC; Supplier Part Number 1: C152962; Tolerance: ±10%; Voltage Rating: 630V; Temperature Coefficient: X7R; RoHS: Yes; ComponentLink1Description: Datasheet; ComponentLink1URL: https://wmsc.lcsc.com/wmsc/upload/file/pdf/v2/lcsc/2304140030_Walsin-Tech-Corp-1206B333K631CT_C152962.pdf; ComponentLink2Description: JLCPCB Part URL; ComponentLink2URL: https://jlcpcb.com/partdetail/C152962; ComponentLink3Description: LCSC Part URL; ComponentLink3URL: https://lcsc.com/product-detail/Multilayer-Ceramic-Capacitors-MLCC---SMD-SMT_Walsin-Tech-Corp-Walsin-Tech-Corp-1206B333K631CT_C152962.html
footprint CAP-1206 (1206 (3216M) Capacitor)
pins: 1, 2
